# Altium schematic symbol library jlcpcb_2025_04_capacitors_extended_0402.schlib: 3594 symbols (part 5 of 20)
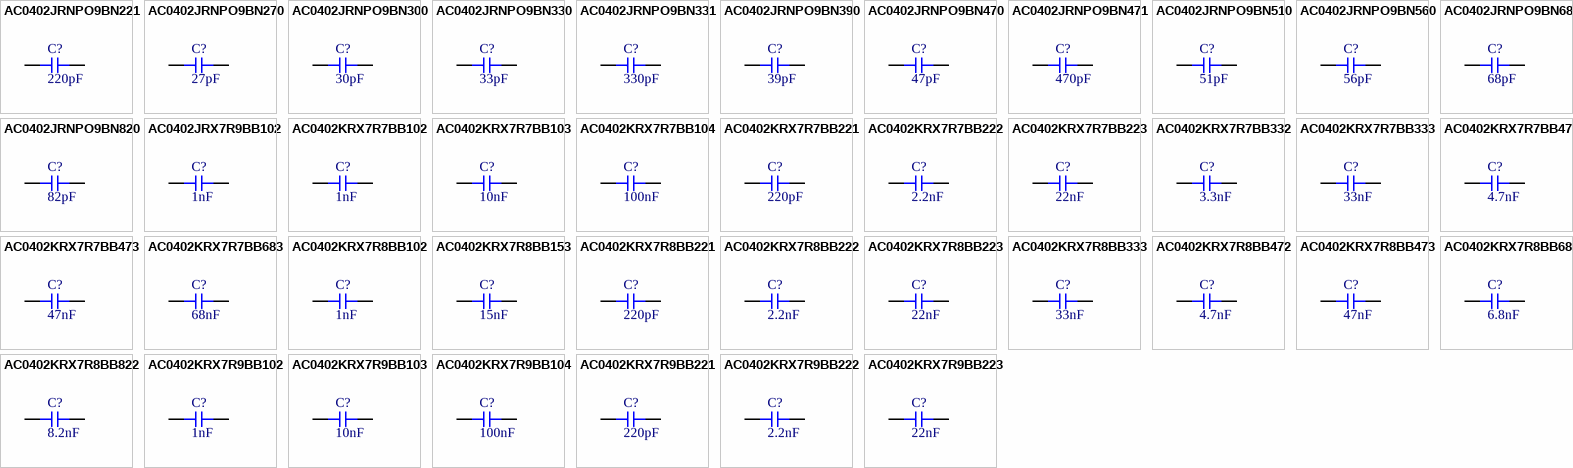
[diagram p93: symbols AC0402JRNPO9BN221 to AC0402KRX7R9BB223]

## AC0402KRX7R7BB222
designator C?  Capacitance: 2.2nF  (hidden comment: *)
Capacitor, Ceramic (MLCC), 2.2nF, ±10%, 16V, X7R, ±10%, SMD 0402; Manufacturer: YAGEO; Manufacturer Part Number: AC0402KRX7R7BB222; Package Size: 0402; JLCPCB Basic Part: No; JLCPCB Part Number: C2180619; Supplier 1: LCSC; Category: Capacitors - MLCC; Supplier Part Number 1: C2180619; Tolerance: ±10%; Voltage Rating: 16V; Temperature Coefficient: X7R; RoHS: Yes; ComponentLink1Description: Datasheet; ComponentLink1URL: https://wmsc.lcsc.com/wmsc/upload/file/pdf/v2/lcsc/2202041130_YAGEO-AC0402KRX7R7BB222_C2180619.pdf; ComponentLink2Description: JLCPCB Part URL; ComponentLink2URL: https://jlcpcb.com/partdetail/C2180619; ComponentLink3Description: LCSC Part URL; ComponentLink3URL: https://lcsc.com/product-detail/Multilayer-Ceramic-Capacitors-MLCC---SMD-SMT_YAGEO-YAGEO-AC0402KRX7R7BB222_C2180619.html
footprint CAP-0402 (0402 (1005M) Capacitor)
pins: 1, 2

## AC0402KRX7R7BB223
designator C?  Capacitance: 22nF  (hidden comment: *)
Capacitor, Ceramic (MLCC), 22nF, ±10%, 16V, X7R, ±10%, SMD 0402; Manufacturer: YAGEO; Manufacturer Part Number: AC0402KRX7R7BB223; Package Size: 0402; JLCPCB Basic Part: No; JLCPCB Part Number: C726516; Supplier 1: LCSC; Category: Capacitors - MLCC; Supplier Part Number 1: C726516; Tolerance: ±10%; Voltage Rating: 16V; Temperature Coefficient: X7R; RoHS: Yes; ComponentLink1Description: Datasheet; ComponentLink1URL: https://wmsc.lcsc.com/wmsc/upload/file/pdf/v2/lcsc/2010041434_YAGEO-AC0402KRX7R7BB223_C726516.pdf; ComponentLink2Description: JLCPCB Part URL; ComponentLink2URL: https://jlcpcb.com/partdetail/C726516; ComponentLink3Description: LCSC Part URL; ComponentLink3URL: https://lcsc.com/product-detail/Multilayer-Ceramic-Capacitors-MLCC---SMD-SMT_YAGEO-YAGEO-AC0402KRX7R7BB223_C726516.html
footprint CAP-0402 (0402 (1005M) Capacitor)
pins: 1, 2

## AC0402KRX7R7BB332
designator C?  Capacitance: 3.3nF  (hidden comment: *)
Capacitor, Ceramic (MLCC), 3.3nF, ±10%, 16V, X7R, ±10%, SMD 0402; Manufacturer: YAGEO; Manufacturer Part Number: AC0402KRX7R7BB332; Package Size: 0402; JLCPCB Basic Part: No; JLCPCB Part Number: C2176925; Supplier 1: LCSC; Category: Capacitors - MLCC; Supplier Part Number 1: C2176925; Tolerance: ±10%; Voltage Rating: 16V; Temperature Coefficient: X7R; RoHS: Yes; ComponentLink1Description: Datasheet; ComponentLink1URL: https://wmsc.lcsc.com/wmsc/upload/file/pdf/v2/lcsc/2202040830_YAGEO-AC0402KRX7R7BB332_C2176925.pdf; ComponentLink2Description: JLCPCB Part URL; ComponentLink2URL: https://jlcpcb.com/partdetail/C2176925; ComponentLink3Description: LCSC Part URL; ComponentLink3URL: https://lcsc.com/product-detail/Multilayer-Ceramic-Capacitors-MLCC---SMD-SMT_YAGEO-YAGEO-AC0402KRX7R7BB332_C2176925.html
footprint CAP-0402 (0402 (1005M) Capacitor)
pins: 1, 2

## AC0402KRX7R7BB333
designator C?  Capacitance: 33nF  (hidden comment: *)
Capacitor, Ceramic (MLCC), 33nF, ±10%, 16V, X7R, ±10%, SMD 0402; Manufacturer: YAGEO; Manufacturer Part Number: AC0402KRX7R7BB333; Package Size: 0402; JLCPCB Basic Part: No; JLCPCB Part Number: C726517; Supplier 1: LCSC; Category: Capacitors - MLCC; Supplier Part Number 1: C726517; Tolerance: ±10%; Voltage Rating: 16V; Temperature Coefficient: X7R; RoHS: Yes; ComponentLink1Description: Datasheet; ComponentLink1URL: https://wmsc.lcsc.com/wmsc/upload/file/pdf/v2/lcsc/2105241335_YAGEO-AC0402KRX7R7BB333_C726517.pdf; ComponentLink2Description: JLCPCB Part URL; ComponentLink2URL: https://jlcpcb.com/partdetail/C726517; ComponentLink3Description: LCSC Part URL; ComponentLink3URL: https://lcsc.com/product-detail/Multilayer-Ceramic-Capacitors-MLCC---SMD-SMT_YAGEO-YAGEO-AC0402KRX7R7BB333_C726517.html
footprint CAP-0402 (0402 (1005M) Capacitor)
pins: 1, 2

## AC0402KRX7R7BB472
designator C?  Capacitance: 4.7nF  (hidden comment: *)
Capacitor, Ceramic (MLCC), 4.7nF, ±10%, 16V, X7R, ±10%, SMD 0402; Manufacturer: YAGEO; Manufacturer Part Number: AC0402KRX7R7BB472; Package Size: 0402; JLCPCB Basic Part: No; JLCPCB Part Number: C3839180; Supplier 1: LCSC; Category: Capacitors - MLCC; Supplier Part Number 1: C3839180; Tolerance: ±10%; Voltage Rating: 16V; Temperature Coefficient: X7R; RoHS: Yes; ComponentLink1Description: Datasheet; ComponentLink1URL: https://wmsc.lcsc.com/wmsc/upload/file/pdf/v2/lcsc/2311211113_YAGEO-AC0402KRX7R7BB472_C3839180.pdf; ComponentLink2Description: JLCPCB Part URL; ComponentLink2URL: https://jlcpcb.com/partdetail/C3839180; ComponentLink3Description: LCSC Part URL; ComponentLink3URL: https://lcsc.com/product-detail/Multilayer-Ceramic-Capacitors-MLCC---SMD-SMT_YAGEO-YAGEO-AC0402KRX7R7BB472_C3839180.html
footprint CAP-0402 (0402 (1005M) Capacitor)
pins: 1, 2

## AC0402KRX7R7BB473
designator C?  Capacitance: 47nF  (hidden comment: *)
Capacitor, Ceramic (MLCC), 47nF, ±10%, 16V, X7R, ±10%, SMD 0402; Manufacturer: YAGEO; Manufacturer Part Number: AC0402KRX7R7BB473; Package Size: 0402; JLCPCB Basic Part: No; JLCPCB Part Number: C726518; Supplier 1: LCSC; Category: Capacitors - MLCC; Supplier Part Number 1: C726518; Tolerance: ±10%; Voltage Rating: 16V; Temperature Coefficient: X7R; RoHS: Yes; ComponentLink1Description: Datasheet; ComponentLink1URL: https://wmsc.lcsc.com/wmsc/upload/file/pdf/v2/lcsc/2010311304_YAGEO-AC0402KRX7R7BB473_C726518.pdf; ComponentLink2Description: JLCPCB Part URL; ComponentLink2URL: https://jlcpcb.com/partdetail/C726518; ComponentLink3Description: LCSC Part URL; ComponentLink3URL: https://lcsc.com/product-detail/Multilayer-Ceramic-Capacitors-MLCC---SMD-SMT_YAGEO-YAGEO-AC0402KRX7R7BB473_C726518.html
footprint CAP-0402 (0402 (1005M) Capacitor)
pins: 1, 2

## AC0402KRX7R7BB683
designator C?  Capacitance: 68nF  (hidden comment: *)
Capacitor, Ceramic (MLCC), 68nF, ±10%, 16V, X7R, ±10%, SMD 0402; Manufacturer: YAGEO; Manufacturer Part Number: AC0402KRX7R7BB683; Package Size: 0402; JLCPCB Basic Part: No; JLCPCB Part Number: C726519; Supplier 1: LCSC; Category: Capacitors - MLCC; Supplier Part Number 1: C726519; Tolerance: ±10%; Voltage Rating: 16V; Temperature Coefficient: X7R; RoHS: Yes; ComponentLink1Description: Datasheet; ComponentLink1URL: https://wmsc.lcsc.com/wmsc/upload/file/pdf/v2/lcsc/2009181006_YAGEO-AC0402KRX7R7BB683_C726519.pdf; ComponentLink2Description: JLCPCB Part URL; ComponentLink2URL: https://jlcpcb.com/partdetail/C726519; ComponentLink3Description: LCSC Part URL; ComponentLink3URL: https://lcsc.com/product-detail/Multilayer-Ceramic-Capacitors-MLCC---SMD-SMT_YAGEO-YAGEO-AC0402KRX7R7BB683_C726519.html
footprint CAP-0402 (0402 (1005M) Capacitor)
pins: 1, 2

## AC0402KRX7R8BB102
designator C?  Capacitance: 1nF  (hidden comment: *)
Capacitor, Ceramic (MLCC), 1nF, ±10%, 25V, X7R, ±10%, SMD 0402; Manufacturer: YAGEO; Manufacturer Part Number: AC0402KRX7R8BB102; Package Size: 0402; JLCPCB Basic Part: No; JLCPCB Part Number: C726520; Supplier 1: LCSC; Category: Capacitors - MLCC; Supplier Part Number 1: C726520; Tolerance: ±10%; Voltage Rating: 25V; Temperature Coefficient: X7R; RoHS: Yes; ComponentLink1Description: Datasheet; ComponentLink1URL: https://wmsc.lcsc.com/wmsc/upload/file/pdf/v2/lcsc/2009191609_YAGEO-AC0402KRX7R8BB102_C726520.pdf; ComponentLink2Description: JLCPCB Part URL; ComponentLink2URL: https://jlcpcb.com/partdetail/C726520; ComponentLink3Description: LCSC Part URL; ComponentLink3URL: https://lcsc.com/product-detail/Multilayer-Ceramic-Capacitors-MLCC---SMD-SMT_YAGEO-YAGEO-AC0402KRX7R8BB102_C726520.html
footprint CAP-0402 (0402 (1005M) Capacitor)
pins: 1, 2

## AC0402KRX7R8BB153
designator C?  Capacitance: 15nF  (hidden comment: *)
Capacitor, Ceramic (MLCC), 15nF, ±10%, 25V, X7R, ±10%, SMD 0402; Manufacturer: YAGEO; Manufacturer Part Number: AC0402KRX7R8BB153; Package Size: 0402; JLCPCB Basic Part: No; JLCPCB Part Number: C705010; Supplier 1: LCSC; Category: Capacitors - MLCC; Supplier Part Number 1: C705010; Tolerance: ±10%; Voltage Rating: 25V; Temperature Coefficient: X7R; RoHS: Yes; ComponentLink1Description: Datasheet; ComponentLink1URL: https://wmsc.lcsc.com/wmsc/upload/file/pdf/v2/lcsc/2304140030_YAGEO-AC0402KRX7R8BB153_C705010.pdf; ComponentLink2Description: JLCPCB Part URL; ComponentLink2URL: https://jlcpcb.com/partdetail/C705010; ComponentLink3Description: LCSC Part URL; ComponentLink3URL: https://lcsc.com/product-detail/Multilayer-Ceramic-Capacitors-MLCC---SMD-SMT_YAGEO-YAGEO-AC0402KRX7R8BB153_C705010.html
footprint CAP-0402 (0402 (1005M) Capacitor)
pins: 1, 2

## AC0402KRX7R8BB221
designator C?  Capacitance: 220pF  (hidden comment: *)
Capacitor, Ceramic (MLCC), 220pF, ±10%, 25V, X7R, ±10%, SMD 0402; Manufacturer: YAGEO; Manufacturer Part Number: AC0402KRX7R8BB221; Package Size: 0402; JLCPCB Basic Part: No; JLCPCB Part Number: C3838777; Supplier 1: LCSC; Category: Capacitors - MLCC; Supplier Part Number 1: C3838777; Tolerance: ±10%; Voltage Rating: 25V; Temperature Coefficient: X7R; RoHS: Yes; ComponentLink1Description: Datasheet; ComponentLink1URL: https://wmsc.lcsc.com/wmsc/upload/file/pdf/v2/lcsc/2311211113_YAGEO-AC0402KRX7R8BB221_C3838777.pdf; ComponentLink2Description: JLCPCB Part URL; ComponentLink2URL: https://jlcpcb.com/partdetail/C3838777; ComponentLink3Description: LCSC Part URL; ComponentLink3URL: https://lcsc.com/product-detail/Multilayer-Ceramic-Capacitors-MLCC---SMD-SMT_YAGEO-YAGEO-AC0402KRX7R8BB221_C3838777.html
footprint CAP-0402 (0402 (1005M) Capacitor)
pins: 1, 2

## AC0402KRX7R8BB222
designator C?  Capacitance: 2.2nF  (hidden comment: *)
Capacitor, Ceramic (MLCC), 2.2nF, ±10%, 25V, X7R, ±10%, SMD 0402; Manufacturer: YAGEO; Manufacturer Part Number: AC0402KRX7R8BB222; Package Size: 0402; JLCPCB Basic Part: No; JLCPCB Part Number: C3861306; Supplier 1: LCSC; Category: Capacitors - MLCC; Supplier Part Number 1: C3861306; Tolerance: ±10%; Voltage Rating: 25V; Temperature Coefficient: X7R; RoHS: Yes; ComponentLink1Description: Datasheet; ComponentLink1URL: https://wmsc.lcsc.com/wmsc/upload/file/pdf/v2/lcsc/2311211113_YAGEO-AC0402KRX7R8BB222_C3861306.pdf; ComponentLink2Description: JLCPCB Part URL; ComponentLink2URL: https://jlcpcb.com/partdetail/C3861306; ComponentLink3Description: LCSC Part URL; ComponentLink3URL: https://lcsc.com/product-detail/Multilayer-Ceramic-Capacitors-MLCC---SMD-SMT_YAGEO-YAGEO-AC0402KRX7R8BB222_C3861306.html
footprint CAP-0402 (0402 (1005M) Capacitor)
pins: 1, 2

## AC0402KRX7R8BB223
designator C?  Capacitance: 22nF  (hidden comment: *)
Capacitor, Ceramic (MLCC), 22nF, ±10%, 25V, X7R, ±10%, SMD 0402; Manufacturer: YAGEO; Manufacturer Part Number: AC0402KRX7R8BB223; Package Size: 0402; JLCPCB Basic Part: No; JLCPCB Part Number: C309128; Supplier 1: LCSC; Category: Capacitors - MLCC; Supplier Part Number 1: C309128; Tolerance: ±10%; Voltage Rating: 25V; Temperature Coefficient: X7R; RoHS: Yes; ComponentLink1Description: Datasheet; ComponentLink1URL: https://wmsc.lcsc.com/wmsc/upload/file/pdf/v2/lcsc/2304140030_YAGEO-AC0402KRX7R8BB223_C309128.pdf; ComponentLink2Description: JLCPCB Part URL; ComponentLink2URL: https://jlcpcb.com/partdetail/C309128; ComponentLink3Description: LCSC Part URL; ComponentLink3URL: https://lcsc.com/product-detail/Multilayer-Ceramic-Capacitors-MLCC---SMD-SMT_YAGEO-YAGEO-AC0402KRX7R8BB223_C309128.html
footprint CAP-0402 (0402 (1005M) Capacitor)
pins: 1, 2

## AC0402KRX7R8BB333
designator C?  Capacitance: 33nF  (hidden comment: *)
Capacitor, Ceramic (MLCC), 33nF, ±10%, 25V, X7R, ±10%, SMD 0402; Manufacturer: YAGEO; Manufacturer Part Number: AC0402KRX7R8BB333; Package Size: 0402; JLCPCB Basic Part: No; JLCPCB Part Number: C726523; Supplier 1: LCSC; Category: Capacitors - MLCC; Supplier Part Number 1: C726523; Tolerance: ±10%; Voltage Rating: 25V; Temperature Coefficient: X7R; RoHS: Yes; ComponentLink1Description: Datasheet; ComponentLink1URL: https://wmsc.lcsc.com/wmsc/upload/file/pdf/v2/lcsc/2010221004_YAGEO-AC0402KRX7R8BB333_C726523.pdf; ComponentLink2Description: JLCPCB Part URL; ComponentLink2URL: https://jlcpcb.com/partdetail/C726523; ComponentLink3Description: LCSC Part URL; ComponentLink3URL: https://lcsc.com/product-detail/Multilayer-Ceramic-Capacitors-MLCC---SMD-SMT_YAGEO-YAGEO-AC0402KRX7R8BB333_C726523.html
footprint CAP-0402 (0402 (1005M) Capacitor)
pins: 1, 2

## AC0402KRX7R8BB472
designator C?  Capacitance: 4.7nF  (hidden comment: *)
Capacitor, Ceramic (MLCC), 4.7nF, ±10%, 25V, X7R, ±10%, SMD 0402; Manufacturer: YAGEO; Manufacturer Part Number: AC0402KRX7R8BB472; Package Size: 0402; JLCPCB Basic Part: No; JLCPCB Part Number: C726524; Supplier 1: LCSC; Category: Capacitors - MLCC; Supplier Part Number 1: C726524; Tolerance: ±10%; Voltage Rating: 25V; Temperature Coefficient: X7R; RoHS: Yes; ComponentLink1Description: Datasheet; ComponentLink1URL: https://wmsc.lcsc.com/wmsc/upload/file/pdf/v2/lcsc/2010311304_YAGEO-AC0402KRX7R8BB472_C726524.pdf; ComponentLink2Description: JLCPCB Part URL; ComponentLink2URL: https://jlcpcb.com/partdetail/C726524; ComponentLink3Description: LCSC Part URL; ComponentLink3URL: https://lcsc.com/product-detail/Multilayer-Ceramic-Capacitors-MLCC---SMD-SMT_YAGEO-YAGEO-AC0402KRX7R8BB472_C726524.html
footprint CAP-0402 (0402 (1005M) Capacitor)
pins: 1, 2

## AC0402KRX7R8BB473
designator C?  Capacitance: 47nF  (hidden comment: *)
Capacitor, Ceramic (MLCC), 47nF, ±10%, 25V, X7R, ±10%, SMD 0402; Manufacturer: YAGEO; Manufacturer Part Number: AC0402KRX7R8BB473; Package Size: 0402; JLCPCB Basic Part: No; JLCPCB Part Number: C726525; Supplier 1: LCSC; Category: Capacitors - MLCC; Supplier Part Number 1: C726525; Tolerance: ±10%; Voltage Rating: 25V; Temperature Coefficient: X7R; RoHS: Yes; ComponentLink1Description: Datasheet; ComponentLink1URL: https://wmsc.lcsc.com/wmsc/upload/file/pdf/v2/lcsc/2010041434_YAGEO-AC0402KRX7R8BB473_C726525.pdf; ComponentLink2Description: JLCPCB Part URL; ComponentLink2URL: https://jlcpcb.com/partdetail/C726525; ComponentLink3Description: LCSC Part URL; ComponentLink3URL: https://lcsc.com/product-detail/Multilayer-Ceramic-Capacitors-MLCC---SMD-SMT_YAGEO-YAGEO-AC0402KRX7R8BB473_C726525.html
footprint CAP-0402 (0402 (1005M) Capacitor)
pins: 1, 2

## AC0402KRX7R8BB682
designator C?  Capacitance: 6.8nF  (hidden comment: *)
Capacitor, Ceramic (MLCC), 6.8nF, ±10%, 25V, X7R, ±10%, SMD 0402; Manufacturer: YAGEO; Manufacturer Part Number: AC0402KRX7R8BB682; Package Size: 0402; JLCPCB Basic Part: No; JLCPCB Part Number: C326965; Supplier 1: LCSC; Category: Capacitors - MLCC; Supplier Part Number 1: C326965; Tolerance: ±10%; Voltage Rating: 25V; Temperature Coefficient: X7R; RoHS: Yes; ComponentLink1Description: Datasheet; ComponentLink1URL: https://wmsc.lcsc.com/wmsc/upload/file/pdf/v2/lcsc/1811141234_YAGEO-AC0402KRX7R8BB682_C326965.pdf; ComponentLink2Description: JLCPCB Part URL; ComponentLink2URL: https://jlcpcb.com/partdetail/C326965; ComponentLink3Description: LCSC Part URL; ComponentLink3URL: https://lcsc.com/product-detail/Multilayer-Ceramic-Capacitors-MLCC---SMD-SMT_YAGEO-YAGEO-AC0402KRX7R8BB682_C326965.html
footprint CAP-0402 (0402 (1005M) Capacitor)
pins: 1, 2

## AC0402KRX7R8BB822
designator C?  Capacitance: 8.2nF  (hidden comment: *)
Capacitor, Ceramic (MLCC), 8.2nF, ±10%, 25V, X7R, ±10%, SMD 0402; Manufacturer: YAGEO; Manufacturer Part Number: AC0402KRX7R8BB822; Package Size: 0402; JLCPCB Basic Part: No; JLCPCB Part Number: C726526; Supplier 1: LCSC; Category: Capacitors - MLCC; Supplier Part Number 1: C726526; Tolerance: ±10%; Voltage Rating: 25V; Temperature Coefficient: X7R; RoHS: Yes; ComponentLink1Description: Datasheet; ComponentLink1URL: https://wmsc.lcsc.com/wmsc/upload/file/pdf/v2/lcsc/2105241335_YAGEO-AC0402KRX7R8BB822_C726526.pdf; ComponentLink2Description: JLCPCB Part URL; ComponentLink2URL: https://jlcpcb.com/partdetail/C726526; ComponentLink3Description: LCSC Part URL; ComponentLink3URL: https://lcsc.com/product-detail/Multilayer-Ceramic-Capacitors-MLCC---SMD-SMT_YAGEO-YAGEO-AC0402KRX7R8BB822_C726526.html
footprint CAP-0402 (0402 (1005M) Capacitor)
pins: 1, 2

## AC0402KRX7R9BB102
designator C?  Capacitance: 1nF  (hidden comment: *)
Capacitor, Ceramic (MLCC), 1nF, ±10%, 50V, X7R, ±10%, SMD 0402; Manufacturer: YAGEO; Manufacturer Part Number: AC0402KRX7R9BB102; Package Size: 0402; JLCPCB Basic Part: No; JLCPCB Part Number: C277522; Supplier 1: LCSC; Category: Capacitors - MLCC; Supplier Part Number 1: C277522; Tolerance: ±10%; Voltage Rating: 50V; Temperature Coefficient: X7R; RoHS: Yes; ComponentLink1Description: Datasheet; ComponentLink1URL: https://wmsc.lcsc.com/wmsc/upload/file/pdf/v2/lcsc/2304140030_YAGEO-AC0402KRX7R9BB102_C277522.pdf; ComponentLink2Description: JLCPCB Part URL; ComponentLink2URL: https://jlcpcb.com/partdetail/C277522; ComponentLink3Description: LCSC Part URL; ComponentLink3URL: https://lcsc.com/product-detail/Multilayer-Ceramic-Capacitors-MLCC---SMD-SMT_YAGEO-YAGEO-AC0402KRX7R9BB102_C277522.html
footprint CAP-0402 (0402 (1005M) Capacitor)
pins: 1, 2

## AC0402KRX7R9BB103
designator C?  Capacitance: 10nF  (hidden comment: *)
Capacitor, Ceramic (MLCC), 10nF, ±10%, 50V, X7R, ±10%, SMD 0402; Manufacturer: YAGEO; Manufacturer Part Number: AC0402KRX7R9BB103; Package Size: 0402; JLCPCB Basic Part: No; JLCPCB Part Number: C277500; Supplier 1: LCSC; Category: Capacitors - MLCC; Supplier Part Number 1: C277500; Tolerance: ±10%; Voltage Rating: 50V; Temperature Coefficient: X7R; RoHS: Yes; ComponentLink1Description: Datasheet; ComponentLink1URL: https://wmsc.lcsc.com/wmsc/upload/file/pdf/v2/lcsc/2304140030_YAGEO-AC0402KRX7R9BB103_C277500.pdf; ComponentLink2Description: JLCPCB Part URL; ComponentLink2URL: https://jlcpcb.com/partdetail/C277500; ComponentLink3Description: LCSC Part URL; ComponentLink3URL: https://lcsc.com/product-detail/Multilayer-Ceramic-Capacitors-MLCC---SMD-SMT_YAGEO-YAGEO-AC0402KRX7R9BB103_C277500.html
footprint CAP-0402 (0402 (1005M) Capacitor)
pins: 1, 2

## AC0402KRX7R9BB104
designator C?  Capacitance: 100nF  (hidden comment: *)
Capacitor, Ceramic (MLCC), 100nF, 50V, X7R, SMD 0402; Manufacturer: YAGEO; Manufacturer Part Number: AC0402KRX7R9BB104; Package Size: 0402; JLCPCB Basic Part: No; JLCPCB Part Number: C2888326; Supplier 1: LCSC; Category: Capacitors - MLCC; Supplier Part Number 1: C2888326; Voltage Rating: 50V; Temperature Coefficient: X7R; RoHS: Yes; ComponentLink1Description: Datasheet; ComponentLink1URL: https://wmsc.lcsc.com/wmsc/upload/file/pdf/v2/lcsc/2203311530_YAGEO-AC0402KRX7R9BB104_C2888326.pdf; ComponentLink2Description: JLCPCB Part URL; ComponentLink2URL: https://jlcpcb.com/partdetail/C2888326; ComponentLink3Description: LCSC Part URL; ComponentLink3URL: https://lcsc.com/product-detail/Multilayer-Ceramic-Capacitors-MLCC---SMD-SMT_YAGEO-YAGEO-AC0402KRX7R9BB104_C2888326.html
footprint CAP-0402 (0402 (1005M) Capacitor)
pins: 1, 2

## AC0402KRX7R9BB221
designator C?  Capacitance: 220pF  (hidden comment: *)
Capacitor, Ceramic (MLCC), 220pF, ±10%, 50V, X7R, ±10%, SMD 0402; Manufacturer: YAGEO; Manufacturer Part Number: AC0402KRX7R9BB221; Package Size: 0402; JLCPCB Basic Part: No; JLCPCB Part Number: C513697; Supplier 1: LCSC; Category: Capacitors - MLCC; Supplier Part Number 1: C513697; Tolerance: ±10%; Voltage Rating: 50V; Temperature Coefficient: X7R; RoHS: Yes; ComponentLink1Description: Datasheet; ComponentLink1URL: https://wmsc.lcsc.com/wmsc/upload/file/pdf/v2/lcsc/2203221230_YAGEO-AC0402KRX7R9BB221_C513697.pdf; ComponentLink2Description: JLCPCB Part URL; ComponentLink2URL: https://jlcpcb.com/partdetail/C513697; ComponentLink3Description: LCSC Part URL; ComponentLink3URL: https://lcsc.com/product-detail/Multilayer-Ceramic-Capacitors-MLCC---SMD-SMT_YAGEO-YAGEO-AC0402KRX7R9BB221_C513697.html
footprint CAP-0402 (0402 (1005M) Capacitor)
pins: 1, 2

## AC0402KRX7R9BB222
designator C?  Capacitance: 2.2nF  (hidden comment: *)
Capacitor, Ceramic (MLCC), 2.2nF, ±10%, 50V, X7R, ±10%, SMD 0402; Manufacturer: YAGEO; Manufacturer Part Number: AC0402KRX7R9BB222; Package Size: 0402; JLCPCB Basic Part: No; JLCPCB Part Number: C309129; Supplier 1: LCSC; Category: Capacitors - MLCC; Supplier Part Number 1: C309129; Tolerance: ±10%; Voltage Rating: 50V; Temperature Coefficient: X7R; RoHS: Yes; ComponentLink1Description: Datasheet; ComponentLink1URL: https://wmsc.lcsc.com/wmsc/upload/file/pdf/v2/lcsc/2304140030_YAGEO-AC0402KRX7R9BB222_C309129.pdf; ComponentLink2Description: JLCPCB Part URL; ComponentLink2URL: https://jlcpcb.com/partdetail/C309129; ComponentLink3Description: LCSC Part URL; ComponentLink3URL: https://lcsc.com/product-detail/Multilayer-Ceramic-Capacitors-MLCC---SMD-SMT_YAGEO-YAGEO-AC0402KRX7R9BB222_C309129.html
footprint CAP-0402 (0402 (1005M) Capacitor)
pins: 1, 2

## AC0402KRX7R9BB223
designator C?  Capacitance: 22nF  (hidden comment: *)
Capacitor, Ceramic (MLCC), 22nF, ±10%, 50V, X7R, ±10%, SMD 0402; Manufacturer: YAGEO; Manufacturer Part Number: AC0402KRX7R9BB223; Package Size: 0402; JLCPCB Basic Part: No; JLCPCB Part Number: C3845655; Supplier 1: LCSC; Category: Capacitors - MLCC; Supplier Part Number 1: C3845655; Tolerance: ±10%; Voltage Rating: 50V; Temperature Coefficient: X7R; RoHS: Yes; ComponentLink1Description: Datasheet; ComponentLink1URL: https://wmsc.lcsc.com/wmsc/upload/file/pdf/v2/lcsc/2311211113_YAGEO-AC0402KRX7R9BB223_C3845655.pdf; ComponentLink2Description: JLCPCB Part URL; ComponentLink2URL: https://jlcpcb.com/partdetail/C3845655; ComponentLink3Description: LCSC Part URL; ComponentLink3URL: https://lcsc.com/product-detail/Multilayer-Ceramic-Capacitors-MLCC---SMD-SMT_YAGEO-YAGEO-AC0402KRX7R9BB223_C3845655.html
footprint CAP-0402 (0402 (1005M) Capacitor)
pins: 1, 2

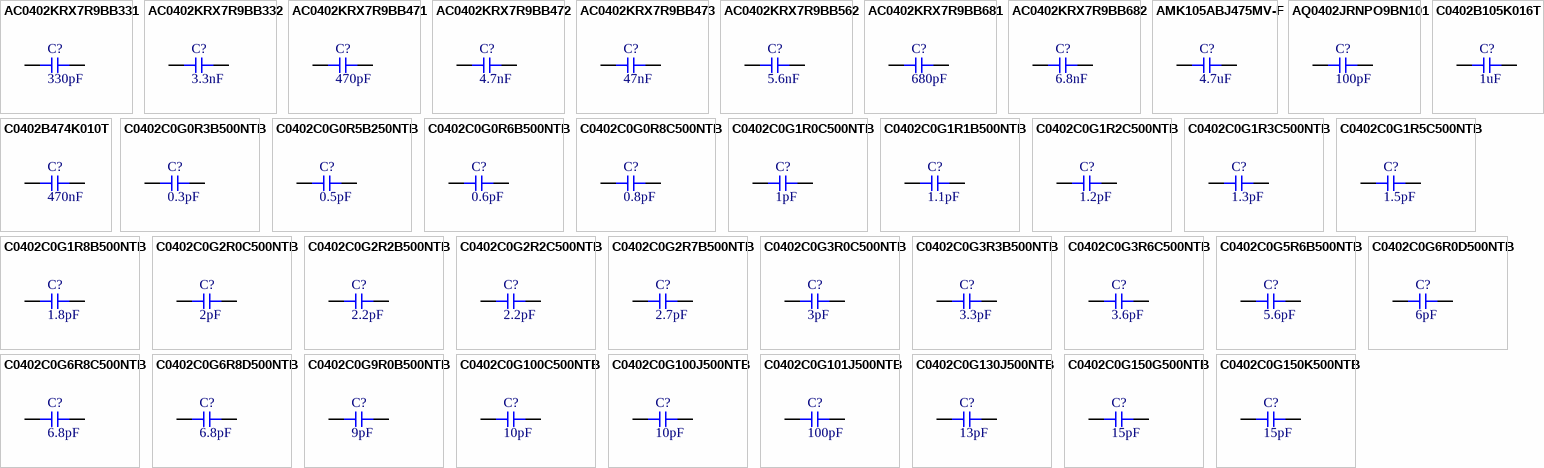
[diagram p19: symbols AC0402KRX7R9BB331 to C0402C0G150K500NTB]

## AC0402KRX7R9BB331
designator C?  Capacitance: 330pF  (hidden comment: *)
Capacitor, Ceramic (MLCC), 330pF, ±10%, 50V, X7R, ±10%, SMD 0402; Manufacturer: YAGEO; Manufacturer Part Number: AC0402KRX7R9BB331; Package Size: 0402; JLCPCB Basic Part: No; JLCPCB Part Number: C726527; Supplier 1: LCSC; Category: Capacitors - MLCC; Supplier Part Number 1: C726527; Tolerance: ±10%; Voltage Rating: 50V; Temperature Coefficient: X7R; RoHS: Yes; ComponentLink1Description: Datasheet; ComponentLink1URL: https://wmsc.lcsc.com/wmsc/upload/file/pdf/v2/lcsc/2009181006_YAGEO-AC0402KRX7R9BB331_C726527.pdf; ComponentLink2Description: JLCPCB Part URL; ComponentLink2URL: https://jlcpcb.com/partdetail/C726527; ComponentLink3Description: LCSC Part URL; ComponentLink3URL: https://lcsc.com/product-detail/Multilayer-Ceramic-Capacitors-MLCC---SMD-SMT_YAGEO-YAGEO-AC0402KRX7R9BB331_C726527.html
footprint CAP-0402 (0402 (1005M) Capacitor)
pins: 1, 2

## AC0402KRX7R9BB332
designator C?  Capacitance: 3.3nF  (hidden comment: *)
Capacitor, Ceramic (MLCC), 3.3nF, ±10%, 50V, X7R, ±10%, SMD 0402; Manufacturer: YAGEO; Manufacturer Part Number: AC0402KRX7R9BB332; Package Size: 0402; JLCPCB Basic Part: No; JLCPCB Part Number: C326966; Supplier 1: LCSC; Category: Capacitors - MLCC; Supplier Part Number 1: C326966; Tolerance: ±10%; Voltage Rating: 50V; Temperature Coefficient: X7R; RoHS: Yes; ComponentLink1Description: Datasheet; ComponentLink1URL: https://wmsc.lcsc.com/wmsc/upload/file/pdf/v2/lcsc/1811141234_YAGEO-AC0402KRX7R9BB332_C326966.pdf; ComponentLink2Description: JLCPCB Part URL; ComponentLink2URL: https://jlcpcb.com/partdetail/C326966; ComponentLink3Description: LCSC Part URL; ComponentLink3URL: https://lcsc.com/product-detail/Multilayer-Ceramic-Capacitors-MLCC---SMD-SMT_YAGEO-YAGEO-AC0402KRX7R9BB332_C326966.html
footprint CAP-0402 (0402 (1005M) Capacitor)
pins: 1, 2

## AC0402KRX7R9BB471
designator C?  Capacitance: 470pF  (hidden comment: *)
Capacitor, Ceramic (MLCC), 470pF, ±10%, 50V, X7R, ±10%, SMD 0402; Manufacturer: YAGEO; Manufacturer Part Number: AC0402KRX7R9BB471; Package Size: 0402; JLCPCB Basic Part: No; JLCPCB Part Number: C605205; Supplier 1: LCSC; Category: Capacitors - MLCC; Supplier Part Number 1: C605205; Tolerance: ±10%; Voltage Rating: 50V; Temperature Coefficient: X7R; RoHS: Yes; ComponentLink1Description: Datasheet; ComponentLink1URL: https://wmsc.lcsc.com/wmsc/upload/file/pdf/v2/lcsc/2304140030_YAGEO-AC0402KRX7R9BB471_C605205.pdf; ComponentLink2Description: JLCPCB Part URL; ComponentLink2URL: https://jlcpcb.com/partdetail/C605205; ComponentLink3Description: LCSC Part URL; ComponentLink3URL: https://lcsc.com/product-detail/Multilayer-Ceramic-Capacitors-MLCC---SMD-SMT_YAGEO-YAGEO-AC0402KRX7R9BB471_C605205.html
footprint CAP-0402 (0402 (1005M) Capacitor)
pins: 1, 2

## AC0402KRX7R9BB472
designator C?  Capacitance: 4.7nF  (hidden comment: *)
Capacitor, Ceramic (MLCC), 4.7nF, ±10%, 50V, X7R, ±10%, SMD 0402; Manufacturer: YAGEO; Manufacturer Part Number: AC0402KRX7R9BB472; Package Size: 0402; JLCPCB Basic Part: No; JLCPCB Part Number: C723619; Supplier 1: LCSC; Category: Capacitors - MLCC; Supplier Part Number 1: C723619; Tolerance: ±10%; Voltage Rating: 50V; Temperature Coefficient: X7R; RoHS: Yes; ComponentLink1Description: Datasheet; ComponentLink1URL: https://wmsc.lcsc.com/wmsc/upload/file/pdf/v2/lcsc/2009181808_YAGEO-AC0402KRX7R9BB472_C723619.pdf; ComponentLink2Description: JLCPCB Part URL; ComponentLink2URL: https://jlcpcb.com/partdetail/C723619; ComponentLink3Description: LCSC Part URL; ComponentLink3URL: https://lcsc.com/product-detail/Multilayer-Ceramic-Capacitors-MLCC---SMD-SMT_YAGEO-YAGEO-AC0402KRX7R9BB472_C723619.html
footprint CAP-0402 (0402 (1005M) Capacitor)
pins: 1, 2

## AC0402KRX7R9BB473
designator C?  Capacitance: 47nF  (hidden comment: *)
Capacitor, Ceramic (MLCC), 47nF, ±10%, 50V, X7R, ±10%, SMD 0402; Manufacturer: YAGEO; Manufacturer Part Number: AC0402KRX7R9BB473; Package Size: 0402; JLCPCB Basic Part: No; JLCPCB Part Number: C3876299; Supplier 1: LCSC; Category: Capacitors - MLCC; Supplier Part Number 1: C3876299; Tolerance: ±10%; Voltage Rating: 50V; Temperature Coefficient: X7R; RoHS: Yes; ComponentLink1Description: Datasheet; ComponentLink1URL: https://wmsc.lcsc.com/wmsc/upload/file/pdf/v2/lcsc/2311211113_YAGEO-AC0402KRX7R9BB473_C3876299.pdf; ComponentLink2Description: JLCPCB Part URL; ComponentLink2URL: https://jlcpcb.com/partdetail/C3876299; ComponentLink3Description: LCSC Part URL; ComponentLink3URL: https://lcsc.com/product-detail/Multilayer-Ceramic-Capacitors-MLCC---SMD-SMT_YAGEO-YAGEO-AC0402KRX7R9BB473_C3876299.html
footprint CAP-0402 (0402 (1005M) Capacitor)
pins: 1, 2

## AC0402KRX7R9BB562
designator C?  Capacitance: 5.6nF  (hidden comment: *)
Capacitor, Ceramic (MLCC), 5.6nF, ±10%, 50V, X7R, ±10%, SMD 0402; Manufacturer: YAGEO; Manufacturer Part Number: AC0402KRX7R9BB562; Package Size: 0402; JLCPCB Basic Part: No; JLCPCB Part Number: C2168605; Supplier 1: LCSC; Category: Capacitors - MLCC; Supplier Part Number 1: C2168605; Tolerance: ±10%; Voltage Rating: 50V; Temperature Coefficient: X7R; RoHS: Yes; ComponentLink1Description: Datasheet; ComponentLink1URL: https://wmsc.lcsc.com/wmsc/upload/file/pdf/v2/lcsc/2202040300_YAGEO-AC0402KRX7R9BB562_C2168605.pdf; ComponentLink2Description: JLCPCB Part URL; ComponentLink2URL: https://jlcpcb.com/partdetail/C2168605; ComponentLink3Description: LCSC Part URL; ComponentLink3URL: https://lcsc.com/product-detail/Multilayer-Ceramic-Capacitors-MLCC---SMD-SMT_YAGEO-YAGEO-AC0402KRX7R9BB562_C2168605.html
footprint CAP-0402 (0402 (1005M) Capacitor)
pins: 1, 2

## AC0402KRX7R9BB681
designator C?  Capacitance: 680pF  (hidden comment: *)
Capacitor, Ceramic (MLCC), 680pF, ±10%, 50V, X7R, ±10%, SMD 0402; Manufacturer: YAGEO; Manufacturer Part Number: AC0402KRX7R9BB681; Package Size: 0402; JLCPCB Basic Part: No; JLCPCB Part Number: C726529; Supplier 1: LCSC; Category: Capacitors - MLCC; Supplier Part Number 1: C726529; Tolerance: ±10%; Voltage Rating: 50V; Temperature Coefficient: X7R; RoHS: Yes; ComponentLink1Description: Datasheet; ComponentLink1URL: https://wmsc.lcsc.com/wmsc/upload/file/pdf/v2/lcsc/2010221004_YAGEO-AC0402KRX7R9BB681_C726529.pdf; ComponentLink2Description: JLCPCB Part URL; ComponentLink2URL: https://jlcpcb.com/partdetail/C726529; ComponentLink3Description: LCSC Part URL; ComponentLink3URL: https://lcsc.com/product-detail/Multilayer-Ceramic-Capacitors-MLCC---SMD-SMT_YAGEO-YAGEO-AC0402KRX7R9BB681_C726529.html
footprint CAP-0402 (0402 (1005M) Capacitor)
pins: 1, 2

## AC0402KRX7R9BB682
designator C?  Capacitance: 6.8nF  (hidden comment: *)
Capacitor, Ceramic (MLCC), 6.8nF, ±10%, 50V, X7R, ±10%, SMD 0402; Manufacturer: YAGEO; Manufacturer Part Number: AC0402KRX7R9BB682; Package Size: 0402; JLCPCB Basic Part: No; JLCPCB Part Number: C723620; Supplier 1: LCSC; Category: Capacitors - MLCC; Supplier Part Number 1: C723620; Tolerance: ±10%; Voltage Rating: 50V; Temperature Coefficient: X7R; RoHS: Yes; ComponentLink1Description: Datasheet; ComponentLink1URL: https://wmsc.lcsc.com/wmsc/upload/file/pdf/v2/lcsc/2009181808_YAGEO-AC0402KRX7R9BB682_C723620.pdf; ComponentLink2Description: JLCPCB Part URL; ComponentLink2URL: https://jlcpcb.com/partdetail/C723620; ComponentLink3Description: LCSC Part URL; ComponentLink3URL: https://lcsc.com/product-detail/Multilayer-Ceramic-Capacitors-MLCC---SMD-SMT_YAGEO-YAGEO-AC0402KRX7R9BB682_C723620.html
footprint CAP-0402 (0402 (1005M) Capacitor)
pins: 1, 2

## AMK105ABJ475MV-F
designator C?  Capacitance: 4.7uF  (hidden comment: *)
Capacitor, Ceramic (MLCC), 4.7uF, ±20%, 4V, X5R, ±20%, SMD 0402; Manufacturer: Taiyo Yuden; Manufacturer Part Number: AMK105ABJ475MV-F; Package Size: 0402; JLCPCB Basic Part: No; JLCPCB Part Number: C524928; Supplier 1: LCSC; Category: Capacitors - MLCC; Supplier Part Number 1: C524928; Tolerance: ±20%; Voltage Rating: 4V; Temperature Coefficient: X5R; RoHS: Yes; ComponentLink1Description: Datasheet; ComponentLink1URL: https://wmsc.lcsc.com/wmsc/upload/file/pdf/v2/lcsc/2006241833_Taiyo-Yuden-AMK105ABJ475MV-F_C524928.pdf; ComponentLink2Description: JLCPCB Part URL; ComponentLink2URL: https://jlcpcb.com/partdetail/C524928; ComponentLink3Description: LCSC Part URL; ComponentLink3URL: https://lcsc.com/product-detail/Multilayer-Ceramic-Capacitors-MLCC---SMD-SMT_Taiyo-Yuden-Taiyo-Yuden-AMK105ABJ475MV-F_C524928.html
footprint CAP-0402 (0402 (1005M) Capacitor)
pins: 1, 2

## AQ0402JRNPO9BN101
designator C?  Capacitance: 100pF  (hidden comment: *)
Capacitor, Ceramic (MLCC), 100pF, ±5%, 50V, C0G, ±5%, SMD 0402; Manufacturer: YAGEO; Manufacturer Part Number: AQ0402JRNPO9BN101; Package Size: 0402; JLCPCB Basic Part: No; JLCPCB Part Number: C3852421; Supplier 1: LCSC; Category: Capacitors - MLCC; Supplier Part Number 1: C3852421; Tolerance: ±5%; Voltage Rating: 50V; Temperature Coefficient: C0G; RoHS: Yes; ComponentLink1Description: Datasheet; ComponentLink1URL: https://wmsc.lcsc.com/wmsc/upload/file/pdf/v2/lcsc/2404030340_YAGEO-AQ0402JRNPO9BN101_C3852421.pdf; ComponentLink2Description: JLCPCB Part URL; ComponentLink2URL: https://jlcpcb.com/partdetail/C3852421; ComponentLink3Description: LCSC Part URL; ComponentLink3URL: https://lcsc.com/product-detail/Multilayer-Ceramic-Capacitors-MLCC---SMD-SMT_YAGEO-YAGEO-AQ0402JRNPO9BN101_C3852421.html
footprint CAP-0402 (0402 (1005M) Capacitor)
pins: 1, 2

## C0402B105K016T
designator C?  Capacitance: 1uF  (hidden comment: *)
Capacitor, Ceramic (MLCC), 1uF, ±10%, 16V, X5R, ±10%, SMD 0402; Manufacturer: IHHEC(HOLY STONE ENTERPRISE CO., LTD); Manufacturer Part Number: C0402B105K016T; Package Size: 0402; JLCPCB Basic Part: No; JLCPCB Part Number: C340321; Supplier 1: LCSC; Category: Capacitors - MLCC; Supplier Part Number 1: C340321; Tolerance: ±10%; Voltage Rating: 16V; Temperature Coefficient: X5R; RoHS: Yes; ComponentLink1Description: Datasheet; ComponentLink1URL: https://wmsc.lcsc.com/wmsc/upload/file/pdf/v2/lcsc/2304140030_IHHEC-HOLY-STONE-ENTERPRISE-CO---LTD-C0402B105K016T_C340321.pdf; ComponentLink2Description: JLCPCB Part URL; ComponentLink2URL: https://jlcpcb.com/partdetail/C340321; ComponentLink3Description: LCSC Part URL; ComponentLink3URL: https://lcsc.com/product-detail/Multilayer-Ceramic-Capacitors-MLCC---SMD-SMT_IHHECHOLY-STONE-ENTERPRISE-CO.%2C-LTD-IHHECHOLY-STONE-ENTERPRISE-CO.%2C-LTD-C0402B105K016T_C340321.html
footprint CAP-0402 (0402 (1005M) Capacitor)
pins: 1, 2

## C0402B474K010T
designator C?  Capacitance: 470nF  (hidden comment: *)
Capacitor, Ceramic (MLCC), 470nF, ±10%, 10V, X5R, ±10%, SMD 0402; Manufacturer: IHHEC(HOLY STONE ENTERPRISE CO., LTD); Manufacturer Part Number: C0402B474K010T; Package Size: 0402; JLCPCB Basic Part: No; JLCPCB Part Number: C188346; Supplier 1: LCSC; Category: Capacitors - MLCC; Supplier Part Number 1: C188346; Tolerance: ±10%; Voltage Rating: 10V; Temperature Coefficient: X5R; RoHS: Yes; ComponentLink1Description: Datasheet; ComponentLink1URL: https://wmsc.lcsc.com/wmsc/upload/file/pdf/v2/lcsc/2304140030_IHHEC-HOLY-STONE-ENTERPRISE-CO---LTD-C0402B474K010T_C188346.pdf; ComponentLink2Description: JLCPCB Part URL; ComponentLink2URL: https://jlcpcb.com/partdetail/C188346; ComponentLink3Description: LCSC Part URL; ComponentLink3URL: https://lcsc.com/product-detail/Multilayer-Ceramic-Capacitors-MLCC---SMD-SMT_IHHECHOLY-STONE-ENTERPRISE-CO.%2C-LTD-IHHECHOLY-STONE-ENTERPRISE-CO.%2C-LTD-C0402B474K010T_C188346.html
footprint CAP-0402 (0402 (1005M) Capacitor)
pins: 1, 2

## C0402C0G0R3B500NTB
designator C?  Capacitance: 0.3pF  (hidden comment: *)
Capacitor, Ceramic (MLCC), 0.3pF, 50V, C0G, SMD 0402; Manufacturer: EYANG(Shenzhen Eyang Tech Development); Manufacturer Part Number: C0402C0G0R3B500NTB; Package Size: 0402; JLCPCB Basic Part: No; JLCPCB Part Number: C140690; Supplier 1: LCSC; Category: Capacitors - MLCC; Supplier Part Number 1: C140690; Voltage Rating: 50V; Temperature Coefficient: C0G; RoHS: Yes; ComponentLink1Description: Datasheet; ComponentLink1URL: https://datasheet.lcsc.com/lcsc/2304140030_EYANG-Shenzhen-Eyang-Tech-Development-C0402C0G0R3B500NTB_C140690.pdf; ComponentLink2Description: JLCPCB Part URL; ComponentLink2URL: https://jlcpcb.com/partdetail/C140690; ComponentLink3Description: LCSC Part URL; ComponentLink3URL: https://lcsc.com/product-detail/Multilayer-Ceramic-Capacitors-MLCC---SMD-SMT_EYANGShenzhen-Eyang-Tech-Development-EYANGShenzhen-Eyang-Tech-Development-C0402C0G0R3B500NTB_C140690.html
footprint CAP-0402 (0402 (1005M) Capacitor)
pins: 1, 2

## C0402C0G0R5B250NTB
designator C?  Capacitance: 0.5pF  (hidden comment: *)
Capacitor, Ceramic (MLCC), 0.5pF, 25V, C0G, SMD 0402; Manufacturer: EYANG(Shenzhen Eyang Tech Development); Manufacturer Part Number: C0402C0G0R5B250NTB; Package Size: 0402; JLCPCB Basic Part: No; JLCPCB Part Number: C314220; Supplier 1: LCSC; Category: Capacitors - MLCC; Supplier Part Number 1: C314220; Voltage Rating: 25V; Temperature Coefficient: C0G; RoHS: Yes; ComponentLink1Description: Datasheet; ComponentLink1URL: https://datasheet.lcsc.com/lcsc/2304140030_EYANG-Shenzhen-Eyang-Tech-Development-C0402C0G0R5B250NTB_C314220.pdf; ComponentLink2Description: JLCPCB Part URL; ComponentLink2URL: https://jlcpcb.com/partdetail/C314220; ComponentLink3Description: LCSC Part URL; ComponentLink3URL: https://lcsc.com/product-detail/Multilayer-Ceramic-Capacitors-MLCC---SMD-SMT_EYANGShenzhen-Eyang-Tech-Development-EYANGShenzhen-Eyang-Tech-Development-C0402C0G0R5B250NTB_C314220.html
footprint CAP-0402 (0402 (1005M) Capacitor)
pins: 1, 2

## C0402C0G0R6B500NTB
designator C?  Capacitance: 0.6pF  (hidden comment: *)
Capacitor, Ceramic (MLCC), 0.6pF, 50V, C0G, SMD 0402; Manufacturer: EYANG(Shenzhen Eyang Tech Development); Manufacturer Part Number: C0402C0G0R6B500NTB; Package Size: 0402; JLCPCB Basic Part: No; JLCPCB Part Number: C778333; Supplier 1: LCSC; Category: Capacitors - MLCC; Supplier Part Number 1: C778333; Voltage Rating: 50V; Temperature Coefficient: C0G; RoHS: Yes; ComponentLink1Description: Datasheet; ComponentLink1URL: https://datasheet.lcsc.com/lcsc/2009051507_EYANG-Shenzhen-Eyang-Tech-Development-C0402C0G0R6B500NTB_C778333.pdf; ComponentLink2Description: JLCPCB Part URL; ComponentLink2URL: https://jlcpcb.com/partdetail/C778333; ComponentLink3Description: LCSC Part URL; ComponentLink3URL: https://lcsc.com/product-detail/Multilayer-Ceramic-Capacitors-MLCC---SMD-SMT_EYANGShenzhen-Eyang-Tech-Development-EYANGShenzhen-Eyang-Tech-Development-C0402C0G0R6B500NTB_C778333.html
footprint CAP-0402 (0402 (1005M) Capacitor)
pins: 1, 2

## C0402C0G0R8C500NTB
designator C?  Capacitance: 0.8pF  (hidden comment: *)
Capacitor, Ceramic (MLCC), 0.8pF, 50V, C0G, SMD 0402; Manufacturer: EYANG(Shenzhen Eyang Tech Development); Manufacturer Part Number: C0402C0G0R8C500NTB; Package Size: 0402; JLCPCB Basic Part: No; JLCPCB Part Number: C115605; Supplier 1: LCSC; Category: Capacitors - MLCC; Supplier Part Number 1: C115605; Voltage Rating: 50V; Temperature Coefficient: C0G; RoHS: Yes; ComponentLink1Description: Datasheet; ComponentLink1URL: https://datasheet.lcsc.com/lcsc/2304140030_EYANG-Shenzhen-Eyang-Tech-Development-C0402C0G0R8C500NTB_C115605.pdf; ComponentLink2Description: JLCPCB Part URL; ComponentLink2URL: https://jlcpcb.com/partdetail/C115605; ComponentLink3Description: LCSC Part URL; ComponentLink3URL: https://lcsc.com/product-detail/Multilayer-Ceramic-Capacitors-MLCC---SMD-SMT_EYANGShenzhen-Eyang-Tech-Development-EYANGShenzhen-Eyang-Tech-Development-C0402C0G0R8C500NTB_C115605.html
footprint CAP-0402 (0402 (1005M) Capacitor)
pins: 1, 2

## C0402C0G1R0C500NTB
designator C?  Capacitance: 1pF  (hidden comment: *)
Capacitor, Ceramic (MLCC), 1pF, 50V, C0G, SMD 0402; Manufacturer: EYANG(Shenzhen Eyang Tech Development); Manufacturer Part Number: C0402C0G1R0C500NTB; Package Size: 0402; JLCPCB Basic Part: No; JLCPCB Part Number: C115612; Supplier 1: LCSC; Category: Capacitors - MLCC; Supplier Part Number 1: C115612; Voltage Rating: 50V; Temperature Coefficient: C0G; RoHS: Yes; ComponentLink1Description: Datasheet; ComponentLink1URL: https://datasheet.lcsc.com/lcsc/2304140030_EYANG-Shenzhen-Eyang-Tech-Development-C0402C0G1R0C500NTB_C115612.pdf; ComponentLink2Description: JLCPCB Part URL; ComponentLink2URL: https://jlcpcb.com/partdetail/C115612; ComponentLink3Description: LCSC Part URL; ComponentLink3URL: https://lcsc.com/product-detail/Multilayer-Ceramic-Capacitors-MLCC---SMD-SMT_EYANGShenzhen-Eyang-Tech-Development-EYANGShenzhen-Eyang-Tech-Development-C0402C0G1R0C500NTB_C115612.html
footprint CAP-0402 (0402 (1005M) Capacitor)
pins: 1, 2

## C0402C0G1R1B500NTB
designator C?  Capacitance: 1.1pF  (hidden comment: *)
Capacitor, Ceramic (MLCC), 1.1pF, 50V, C0G, SMD 0402; Manufacturer: EYANG(Shenzhen Eyang Tech Development); Manufacturer Part Number: C0402C0G1R1B500NTB; Package Size: 0402; JLCPCB Basic Part: No; JLCPCB Part Number: C778206; Supplier 1: LCSC; Category: Capacitors - MLCC; Supplier Part Number 1: C778206; Voltage Rating: 50V; Temperature Coefficient: C0G; RoHS: Yes; ComponentLink1Description: Datasheet; ComponentLink1URL: https://datasheet.lcsc.com/lcsc/2009051608_EYANG-Shenzhen-Eyang-Tech-Development-C0402C0G1R1B500NTB_C778206.pdf; ComponentLink2Description: JLCPCB Part URL; ComponentLink2URL: https://jlcpcb.com/partdetail/C778206; ComponentLink3Description: LCSC Part URL; ComponentLink3URL: https://lcsc.com/product-detail/Multilayer-Ceramic-Capacitors-MLCC---SMD-SMT_EYANGShenzhen-Eyang-Tech-Development-EYANGShenzhen-Eyang-Tech-Development-C0402C0G1R1B500NTB_C778206.html
footprint CAP-0402 (0402 (1005M) Capacitor)
pins: 1, 2

## C0402C0G1R2C500NTB
designator C?  Capacitance: 1.2pF  (hidden comment: *)
Capacitor, Ceramic (MLCC), 1.2pF, 50V, C0G, SMD 0402; Manufacturer: EYANG(Shenzhen Eyang Tech Development); Manufacturer Part Number: C0402C0G1R2C500NTB; Package Size: 0402; JLCPCB Basic Part: No; JLCPCB Part Number: C115613; Supplier 1: LCSC; Category: Capacitors - MLCC; Supplier Part Number 1: C115613; Voltage Rating: 50V; Temperature Coefficient: C0G; RoHS: Yes; ComponentLink1Description: Datasheet; ComponentLink1URL: https://datasheet.lcsc.com/lcsc/2304140030_EYANG-Shenzhen-Eyang-Tech-Development-C0402C0G1R2C500NTB_C115613.pdf; ComponentLink2Description: JLCPCB Part URL; ComponentLink2URL: https://jlcpcb.com/partdetail/C115613; ComponentLink3Description: LCSC Part URL; ComponentLink3URL: https://lcsc.com/product-detail/Multilayer-Ceramic-Capacitors-MLCC---SMD-SMT_EYANGShenzhen-Eyang-Tech-Development-EYANGShenzhen-Eyang-Tech-Development-C0402C0G1R2C500NTB_C115613.html
footprint CAP-0402 (0402 (1005M) Capacitor)
pins: 1, 2

## C0402C0G1R3C500NTB
designator C?  Capacitance: 1.3pF  (hidden comment: *)
Capacitor, Ceramic (MLCC), 1.3pF, 50V, C0G, SMD 0402; Manufacturer: EYANG(Shenzhen Eyang Tech Development); Manufacturer Part Number: C0402C0G1R3C500NTB; Package Size: 0402; JLCPCB Basic Part: No; JLCPCB Part Number: C115614; Supplier 1: LCSC; Category: Capacitors - MLCC; Supplier Part Number 1: C115614; Voltage Rating: 50V; Temperature Coefficient: C0G; RoHS: Yes; ComponentLink1Description: Datasheet; ComponentLink1URL: https://datasheet.lcsc.com/lcsc/2304140030_EYANG-Shenzhen-Eyang-Tech-Development-C0402C0G1R3C500NTB_C115614.pdf; ComponentLink2Description: JLCPCB Part URL; ComponentLink2URL: https://jlcpcb.com/partdetail/C115614; ComponentLink3Description: LCSC Part URL; ComponentLink3URL: https://lcsc.com/product-detail/Multilayer-Ceramic-Capacitors-MLCC---SMD-SMT_EYANGShenzhen-Eyang-Tech-Development-EYANGShenzhen-Eyang-Tech-Development-C0402C0G1R3C500NTB_C115614.html
footprint CAP-0402 (0402 (1005M) Capacitor)
pins: 1, 2
